# Altium footprint library Custom1.PcbLib: 554 footprints (part 21 of 35)
Each footprint in its own frame and in the unit in brackets; x right, y up, seen from the top. Pads: shape width x height; smd on the part's side, far side on the other; paste and mask are expansions set on the pad; w line width, h text height; cw(c..) or ccw(c..) is an arc to the next point about the centre after c.
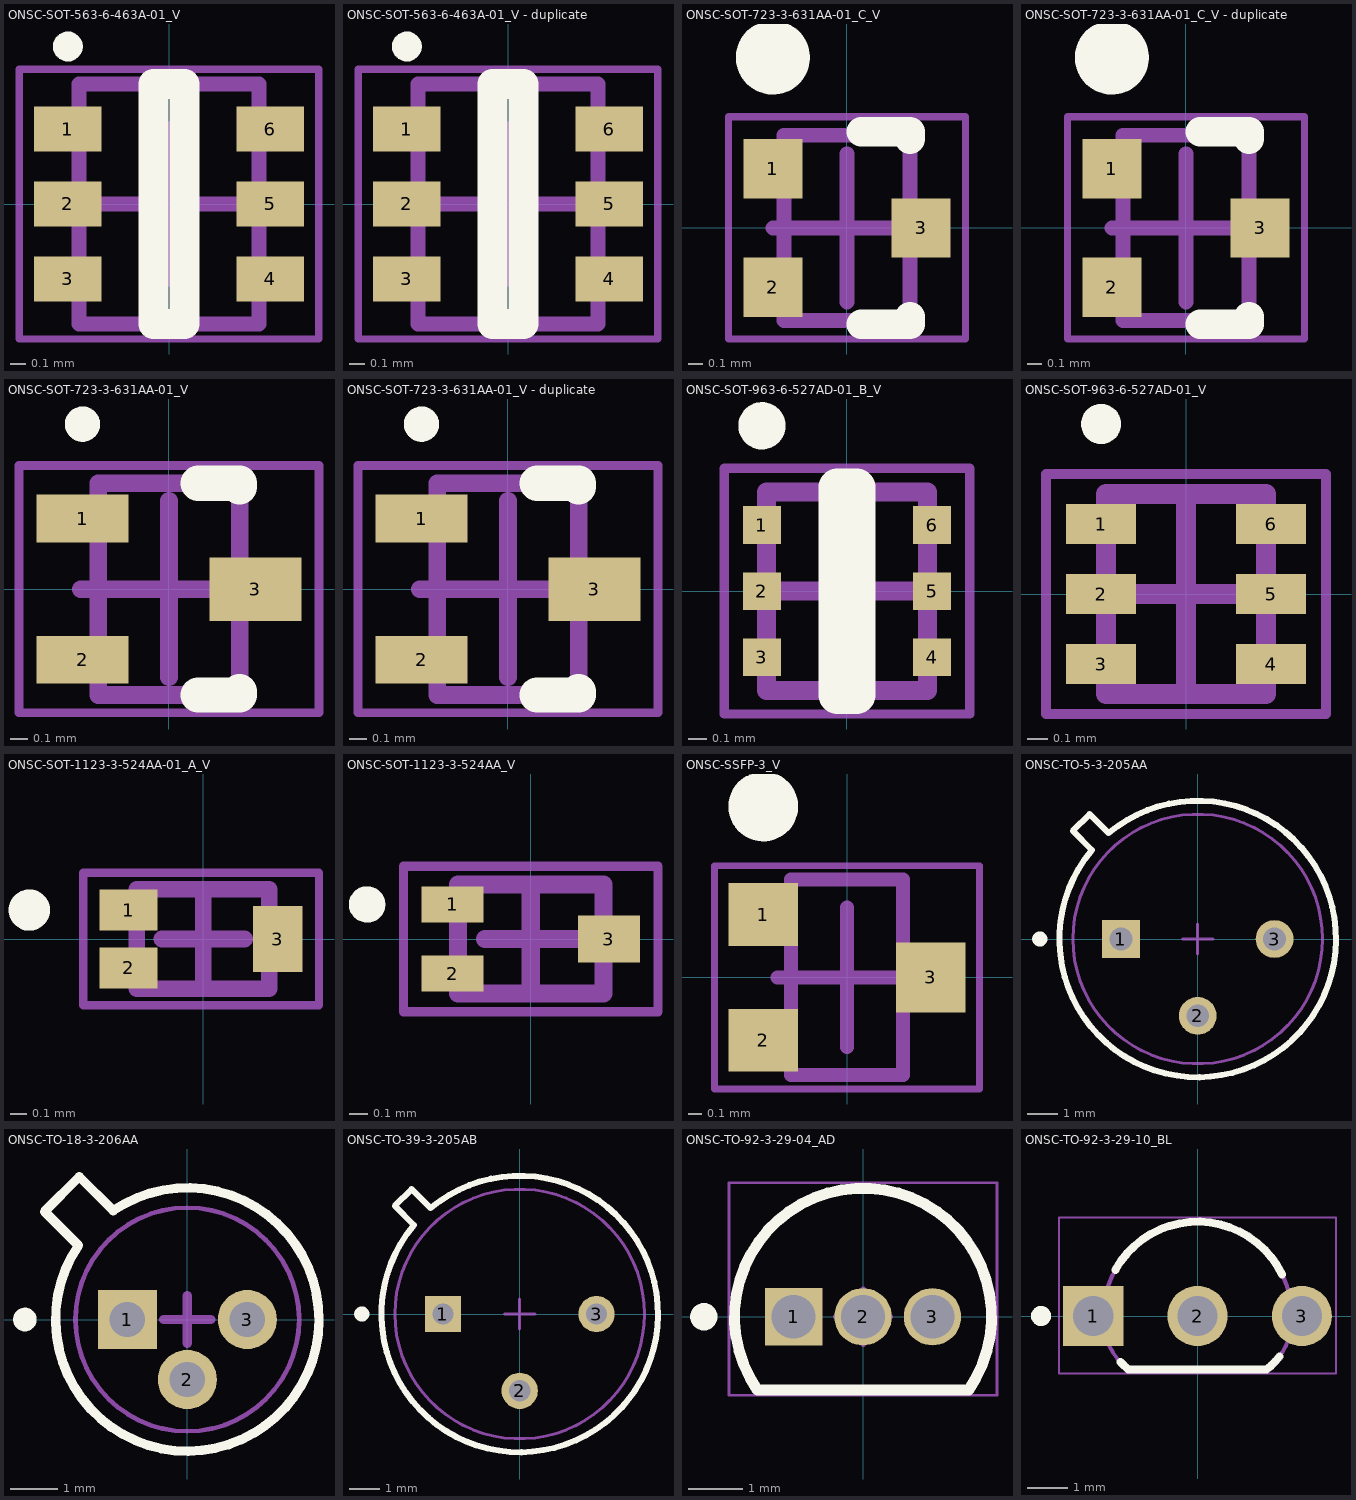
[diagram p20: the footprints below, top view; thin cyan lines are the x and y axes]

## ONSC-SOT-563-6-463A-01_V [mm] "SOT23, 6-Leads, Body 1.6x1.2mm, Pitch 0.5mm"
height 0.6
pads (6):
  rect 0.45x0.3 smd: 1(-0.675,0.5) 2(-0.675,0) 3(-0.675,-0.5) 4(0.675,-0.5) 5(0.675,0) 6(0.675,0.5)
Top Overlay:
  circle w0.1: c-0.675,1.05 r0.05
  lines w0.2: -0.104,-0.8 0.104,-0.8 0.104,0.8 -0.104,0.8 -0.104,-0.8
Mechanical 13:
  lines w0.1: -0.6,-0.8 -0.6,0.8 0.6,0.8 0.6,-0.8 -0.6,-0.8
Mechanical 15:
  lines w0.05: -1,-0.9 -1,0.9 1,0.9 1,-0.9 -1,-0.9
  lines w0.1: -0.5,0 0.5,0 ; 0,-0.5 0,0.5
3D body: height 0.6, standoff 0, extent -0.6,-0.8 0.6,0.8

## ONSC-SOT-563-6-463A-01_V - duplicate [mm] "SOT23, 6-Leads, Body 1.6x1.2mm, Pitch 0.5mm"
height 0.6
pads (6):
  rect 0.45x0.3 smd: 1(-0.675,0.5) 2(-0.675,0) 3(-0.675,-0.5) 4(0.675,-0.5) 5(0.675,0) 6(0.675,0.5)
Top Overlay:
  circle w0.1: c-0.675,1.05 r0.05
  lines w0.2: -0.104,-0.8 -0.104,0.8 0.104,0.8 0.104,-0.8 -0.104,-0.8
Mechanical 13:
  lines w0.1: -0.6,-0.8 0.6,-0.8 0.6,0.8 -0.6,0.8 -0.6,-0.8
Mechanical 15:
  lines w0.05: -1,-0.9 1,-0.9 1,0.9 -1,0.9 -1,-0.9
  lines w0.1: -0.5,0 0.5,0 ; 0,-0.5 0,0.5
3D body: height 0.6, standoff 0, extent -0.6,-0.8 0.6,0.8

## ONSC-SOT-723-3-631AA-01_C_V [mm] "SOT23, 3-Leads, Body 1.25x0.85mm, Pitch 0.4mm"
height 0.55
pads (3):
  rect 0.4x0.4 smd: 1(-0.5,0.4) 2(-0.5,-0.4) 3(0.5,0)
Top Overlay:
  circle w0.25: c-0.5,1.15 r0.125
  lines w0.2: 0.097,-0.65 0.425,-0.65 0.425,-0.6 ; 0.097,0.65 0.425,0.65 0.425,0.6
Mechanical 13:
  lines w0.1: -0.425,-0.625 0.425,-0.625 0.425,0.625 -0.425,0.625 -0.425,-0.625
Mechanical 15:
  lines w0.05: -0.8,-0.75 0.8,-0.75 0.8,0.75 -0.8,0.75 -0.8,-0.75
  lines w0.1: -0.5,0 0.5,0 ; 0,-0.5 0,0.5
3D body: height 0.55, standoff 0, extent -0.425,-0.625 0.425,0.625

## ONSC-SOT-723-3-631AA-01_C_V - duplicate [mm] "SOT23, 3-Leads, Body 1.25x0.85mm, Pitch 0.4mm"
height 0.55
pads (3):
  rect 0.4x0.4 smd: 1(-0.5,0.4) 2(-0.5,-0.4) 3(0.5,0)
Top Overlay:
  circle w0.25: c-0.5,1.15 r0.125
  lines w0.2: 0.097,-0.65 0.425,-0.65 0.425,-0.6 ; 0.097,0.65 0.425,0.65 0.425,0.6
Mechanical 13:
  lines w0.1: -0.425,-0.625 0.425,-0.625 0.425,0.625 -0.425,0.625 -0.425,-0.625
Mechanical 15:
  lines w0.05: -0.8,-0.75 0.8,-0.75 0.8,0.75 -0.8,0.75 -0.8,-0.75
  lines w0.1: -0.5,0 0.5,0 ; 0,-0.5 0,0.5
3D body: height 0.55, standoff 0, extent -0.425,-0.625 0.425,0.625

## ONSC-SOT-723-3-631AA-01_V [mm] "SOT223, 3-Leads, Body 1.2x0.8mm, Pitch 0.4mm"
height 0.55
pads (3):
  rect 0.52x0.27 smd: 1(-0.49,0.4) 2(-0.49,-0.4)
  rect 0.52x0.36 smd: 3(0.49,0)
Top Overlay:
  circle w0.1: c-0.49,0.935 r0.05
  lines w0.2: 0.165,-0.6 0.4,-0.6 0.4,-0.58 ; 0.165,0.6 0.4,0.6 0.4,0.58
Mechanical 13:
  lines w0.1: -0.4,-0.6 -0.4,0.6 0.4,0.6 0.4,-0.6 -0.4,-0.6
Mechanical 15:
  lines w0.05: -0.85,-0.7 -0.85,0.7 0.85,0.7 0.85,-0.7 -0.85,-0.7
  lines w0.1: -0.5,0 0.5,0 ; 0,-0.5 0,0.5
3D body: height 0.55, standoff 0, extent -0.4,-0.6 0.4,0.6

## ONSC-SOT-723-3-631AA-01_V - duplicate [mm] "SOT223, 3-Leads, Body 1.2x0.8mm, Pitch 0.4mm"
height 0.55
pads (3):
  rect 0.52x0.27 smd: 1(-0.49,0.4) 2(-0.49,-0.4)
  rect 0.52x0.36 smd: 3(0.49,0)
Top Overlay:
  circle w0.1: c-0.49,0.935 r0.05
  lines w0.2: 0.165,-0.6 0.4,-0.6 0.4,-0.58 ; 0.165,0.6 0.4,0.6 0.4,0.58
Mechanical 13:
  lines w0.1: -0.4,-0.6 0.4,-0.6 0.4,0.6 -0.4,0.6 -0.4,-0.6
Mechanical 15:
  lines w0.05: -0.85,-0.7 0.85,-0.7 0.85,0.7 -0.85,0.7 -0.85,-0.7
  lines w0.1: -0.5,0 0.5,0 ; 0,-0.5 0,0.5
3D body: height 0.55, standoff 0, extent -0.4,-0.6 0.4,0.6

## ONSC-SOT-963-6-527AD-01_B_V [mm] "SOT23, 6-Leads, Body 1.05x0.85mm, Pitch 0.35mm"
height 0.4
pads (6):
  rect 0.2x0.2 smd: 1(-0.45,0.35) 2(-0.45,0) 3(-0.45,-0.35) 4(0.45,-0.35) 5(0.45,0) 6(0.45,0.35)
Top Overlay:
  circle w0.125: c-0.45,0.875 r0.062
  lines w0.2: -0.05,-0.55 -0.05,0.55 0.05,0.55 0.05,-0.55 -0.05,-0.55
Mechanical 13:
  lines w0.1: -0.425,-0.525 0.425,-0.525 0.425,0.525 -0.425,0.525 -0.425,-0.525
Mechanical 15:
  lines w0.05: -0.65,-0.65 0.65,-0.65 0.65,0.65 -0.65,0.65 -0.65,-0.65
  lines w0.1: -0.5,0 0.5,0 ; 0,-0.5 0,0.5
3D body: height 0.4, standoff 0, extent -0.425,-0.525 0.425,0.525

## ONSC-SOT-963-6-527AD-01_V [mm] "SOT23, 6-Leads, Body 1x0.8mm, Pitch 0.35mm"
height 0.4
pads (6):
  rect 0.35x0.2 smd: 1(-0.425,0.35) 2(-0.425,0) 3(-0.425,-0.35) 4(0.425,-0.35) 5(0.425,0) 6(0.425,0.35)
Top Overlay:
  circle w0.1: c-0.425,0.85 r0.05
Mechanical 13:
  lines w0.1: -0.4,-0.5 0.4,-0.5 0.4,0.5 -0.4,0.5 -0.4,-0.5
Mechanical 15:
  lines w0.05: -0.7,-0.6 0.7,-0.6 0.7,0.6 -0.7,0.6 -0.7,-0.6
  lines w0.1: -0.5,0 0.5,0 ; 0,-0.5 0,0.5
3D body: height 0.4, standoff 0, extent -0.4,-0.5 0.4,0.5

## ONSC-SOT-1123-3-524AA-01_A_V [mm] "SOT, 3-Leads, Body 0.8x0.6mm, Pitch 0.35mm"
height 0.4
pads (3):
  rect 0.35x0.25 smd: 1(-0.45,0.175) 2(-0.45,-0.175)
  rect 0.3x0.4 smd: 3(0.45,0)
Top Overlay:
  circle w0.125: c-1.05,0.175 r0.062
Mechanical 13:
  lines w0.1: -0.4,-0.3 -0.4,0.3 0.4,0.3 0.4,-0.3 -0.4,-0.3
Mechanical 15:
  lines w0.05: -0.725,-0.4 -0.725,0.4 0.7,0.4 0.7,-0.4 -0.725,-0.4
  lines w0.1: -0.25,0 0.25,0 ; 0,-0.25 0,0.25
3D body: height 0.4, standoff 0, extent -0.4,-0.3 0.4,0.3

## ONSC-SOT-1123-3-524AA_V [mm] "SOT223, 3-Leads, Body 0.8x0.6mm, Pitch 0.38mm"
height 0.4
pads (3):
  rect 0.34x0.2 smd: 1(-0.43,0.19) 2(-0.43,-0.19)
  rect 0.34x0.26 smd: 3(0.43,0)
Top Overlay:
  circle w0.1: c-0.9,0.19 r0.05
Mechanical 13:
  lines w0.1: -0.4,-0.3 -0.4,0.3 0.4,0.3 0.4,-0.3 -0.4,-0.3
Mechanical 15:
  lines w0.05: -0.7,-0.4 -0.7,0.4 0.7,0.4 0.7,-0.4 -0.7,-0.4
  lines w0.1: -0.25,0 0.25,0 ; 0,-0.25 0,0.25
3D body: height 0.4, standoff 0, extent -0.4,-0.3 0.4,0.3

## ONSC-SSFP-3_V [mm] "SOT23, 3-Leads, Body 1.4x0.8mm, Pitch 0.45mm"
height 0.65
pads (3):
  rect 0.5x0.45 smd: 1(-0.6,0.45) 2(-0.6,-0.45)
  rect 0.5x0.5 smd: 3(0.6,0)
Top Overlay:
  circle w0.25: c-0.6,1.225 r0.125
Mechanical 13:
  lines w0.1: -0.4,-0.7 0.4,-0.7 0.4,0.7 -0.4,0.7 -0.4,-0.7
Mechanical 15:
  lines w0.05: -0.95,-0.8 0.95,-0.8 0.95,0.8 -0.95,0.8 -0.95,-0.8
  lines w0.1: -0.5,0 0.5,0 ; 0,-0.5 0,0.5
3D body: height 0.65, standoff 0, extent -0.4,-0.7 0.4,0.7

## ONSC-TO-5-3-205AA [mm] "TO, 3-Leads, Diameter 9.145 mm"
height 7.87
pads (3):
  rect 1.25x1.25 hole 0.75: 1(-2.54,0)
  round 1.25 hole 0.75: 2(0,-2.54) 3(2.54,0)
Top Overlay:
  circle w0.25: c-5.223,0 r0.125
  lines w0.2: -4.13,3.575 -3.499,2.944 ccw(c0,0) -2.944,3.499 -3.575,4.13 -4.13,3.575
Mechanical 13:
  circle w0.1: c0,0 r4.127
  lines w0.1: -4.13,3.575 -3.575,4.13 -2.944,3.499 cw(c0,0) -3.499,2.944 -4.13,3.575
Mechanical 15:
  lines w0.1: -0.5,0 0.5,0 ; 0,-0.5 0,0.5
3D body: height 4.45, standoff 1.27, extent -4.577,-4.584 4.574,4.577
3D body: height 7.87, standoff 1.27, extent -4.127,-4.127 4.127,4.127

## ONSC-TO-18-3-206AA [mm] "TO, 3-Leads, Diameter 5.575 mm"
height 6.6
pads (3):
  rect 1.25x1.25 hole 0.75: 1(-1.27,0)
  round 1.25 hole 0.75: 2(0,-1.27) 3(1.27,0)
Top Overlay:
  circle w0.25: c-3.438,0 r0.125
  lines w0.2: -2.306,1.57 -3.021,2.286 -2.286,3.021 -1.569,2.305 ; -2.304,1.569 ccw(c0,0) -1.569,2.304
Mechanical 13:
  circle w0.1: c0,0 r2.368
  lines w0.1: -3.021,2.286 -2.286,3.021 -1.569,2.305 cw(c0,0) -2.305,1.569 -3.021,2.286
Mechanical 15:
  lines w0.2: -0.5,0 0.5,0 ; 0,-0.5 0,0.5
3D body: height 6.6, standoff 1.27, extent -2.367,-2.367 2.367,2.367
3D body: height 2.03, standoff 1.27, extent -3.022,-2.8 2.789,3.022

## ONSC-TO-39-3-205AB [mm] "TO, 3-Leads, Diameter 9.145 mm"
height 7.87
pads (3):
  rect 1.2x1.2 hole 0.7: 1(-2.54,0)
  round 1.2 hole 0.7: 2(0,-2.54) 3(2.54,0)
Top Overlay:
  circle w0.25: c-5.223,0 r0.125
  lines w0.2: -4.13,3.575 -3.499,2.944 ccw(c0,0) -2.944,3.499 -3.575,4.13 -4.13,3.575
Mechanical 13:
  circle w0.1: c0,0 r4.127
  lines w0.1: -4.13,3.575 -3.575,4.13 -2.944,3.499 cw(c0,0) -3.499,2.944 -4.13,3.575
Mechanical 15:
  lines w0.1: -0.5,0 0.5,0 ; 0,-0.5 0,0.5
3D body: height 7.87, standoff 1.27, extent -4.127,-4.127 4.127,4.127
3D body: height 4.54, standoff 1.27, extent -4.577,-4.584 4.574,4.577

## ONSC-TO-92-3-29-04_AD [mm] "TO, 3-Leads, Body Dia 4.7mm, Pitch 1.27mm"
height 7.87
pads (3):
  rect 1.05x1.05 hole 0.8: 1(-1.27,0)
  round 1.05 hole 0.8: 2(0,0) 3(1.27,0)
Top Overlay:
  circle w0.25: c-2.911,0 r0.125
  lines w0.2: -1.933,-1.337 cw(c0,0) 1.933,-1.337 -1.933,-1.337
Mechanical 13:
  lines w0.1: -1.933,-1.337 cw(c0,0) 1.933,-1.337 ; -1.933,-1.335 1.933,-1.335
Mechanical 15:
  lines w0.05: -2.45,-1.435 2.45,-1.435 2.45,2.45 -2.45,2.45 -2.45,-1.435
  lines w0.1: -0.5,0 0.5,0 ; 0,-0.5 0,0.5
3D body: height 7.87, standoff 2.54, extent -2.357,-1.335 2.349,2.359

## ONSC-TO-92-3-29-10_BL [mm] "TO, 3-Leads, Body Dia 4.7 mm, Pitch 2.6 mm"
height 10.41
pads (3):
  rect 1.5x1.5 hole 1: 1(-2.6,0)
  round 1.5 hole 1: 2(0,0) 3(2.6,0)
Top Overlay:
  circle w0.25: c-3.9,0 r0.125
  lines w0.2: -2.05,1.15 cw(c0,0) 2.108,1.04 ; -1.922,-1.15 ccw(c-0.773,-0.068) -1.715,-1.335 1.715,-1.335 ccw(c0.773,-0.068) 2.043,-1.006
Mechanical 13:
  lines w0.1: -2.35,0 ccw(c-0.773,-0.068) -1.715,-1.335 1.715,-1.335 ccw(c0.773,-0.068) 2.35,0 ; -2.35,0 cw(c0,0) 2.35,0
Mechanical 15:
  lines w0.05: -3.45,-1.435 3.45,-1.435 3.45,2.45 -3.45,2.45 -3.45,-1.435
  lines w0.1: -0.5,0 0.5,0 ; 0,-0.5 0,0.5
3D body: height 10.41, standoff 2.54, extent -2.359,-1.336 2.352,0
3D body: height 7.87, standoff 2.54, extent -2.351,-0.001 2.351,2.351